# Altium footprint library iMag.PcbLib: 52 footprints (part 2 of 4)
Each footprint in its own frame and in the unit in brackets; x right, y up, seen from the top. Pads: shape width x height; smd on the part's side, far side on the other; paste and mask are expansions set on the pad; w line width, h text height; cw(c..) or ccw(c..) is an arc to the next point about the centre after c.
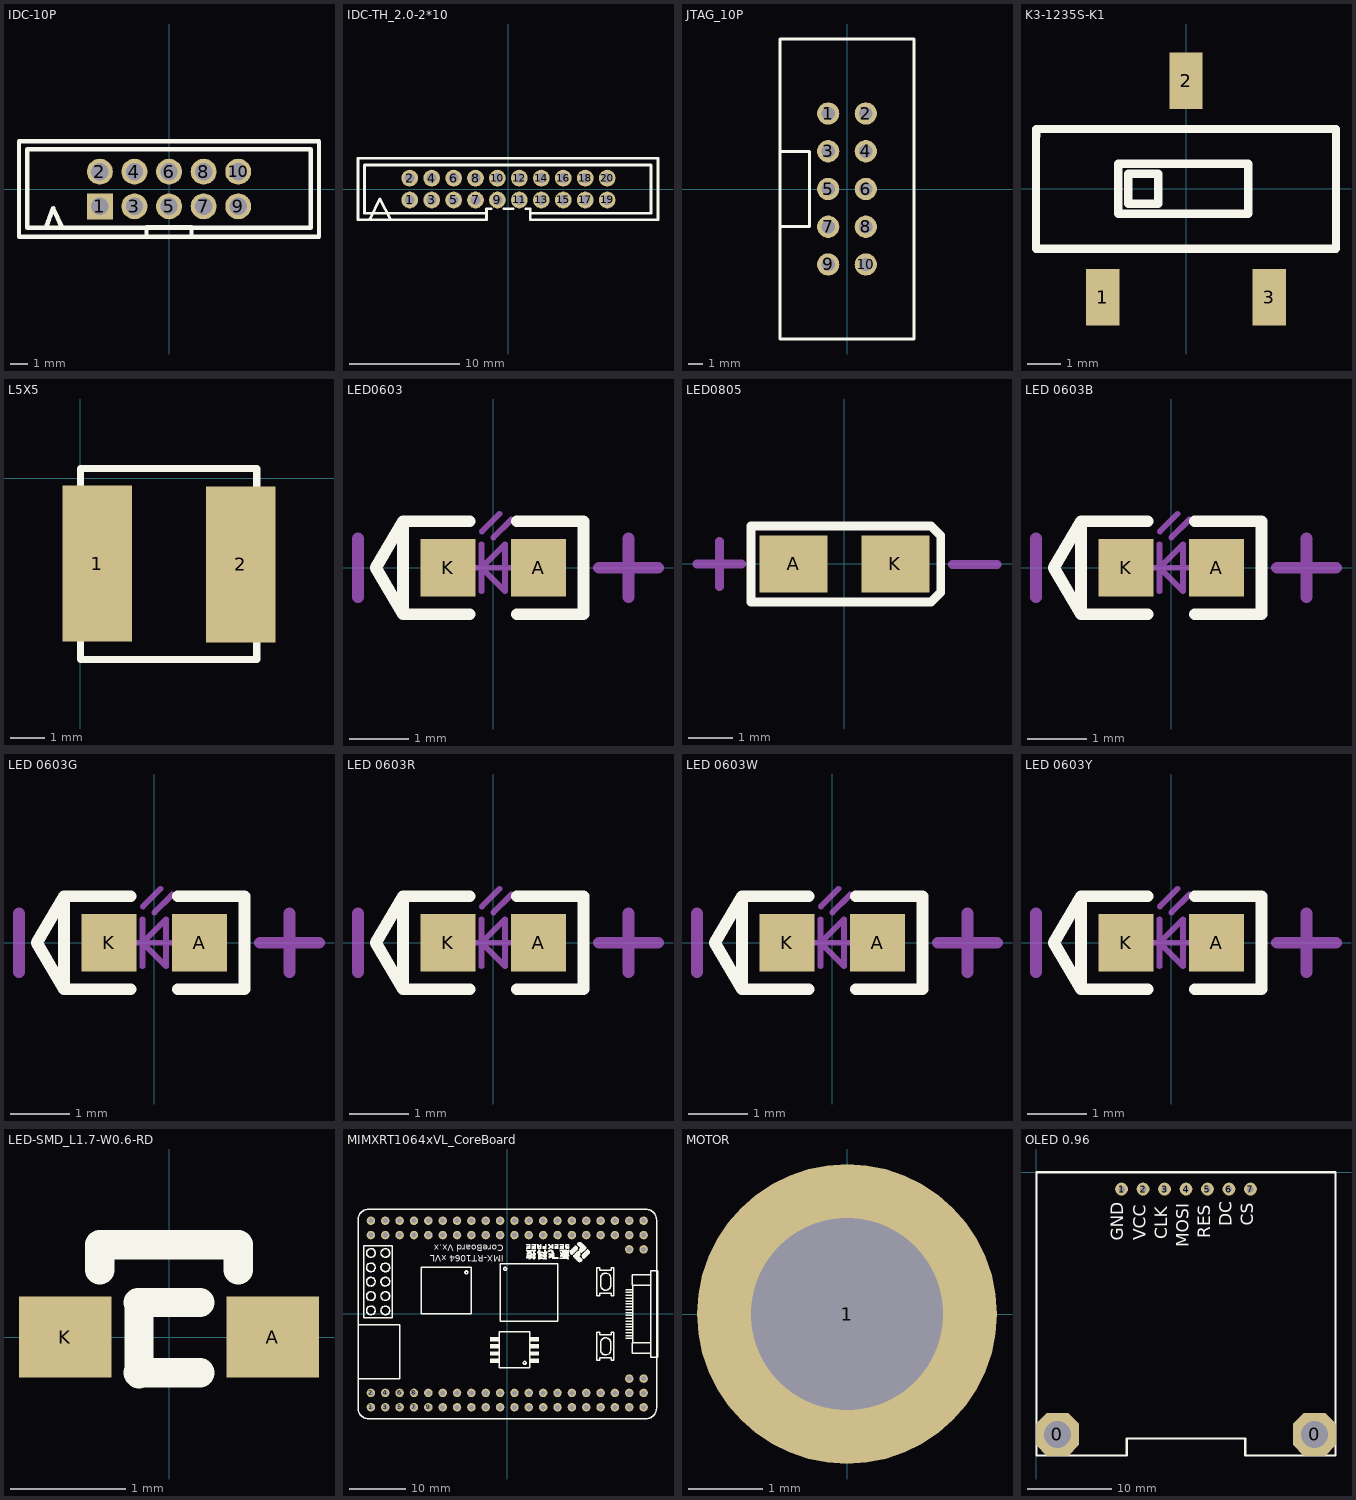
[diagram p1: the footprints below, top view; thin cyan lines are the x and y axes]

## IDC-10P [mm]
pads (10):
  rect 1.5x1.5 hole 1: 1(-4,-1)
  round 1.5 hole 1: 2(-4,1) 3(-2,-1) 4(-2,1) 5(0,-1) 6(0,1) 7(2,-1) 8(2,1) 9(4,-1) 10(4,1)
Top Overlay:
  lines w0.254: -7.1,-2.2 -6.7,-1.1 -6.2,-2.2 ; -1.3,-2.749 -1.3,-2.201 1.301,-2.201 1.301,-2.749 ; -8.672,-2.75 8.668,-2.75 8.668,2.75 -8.672,2.75 -8.672,-2.75 ; -8.2,-2.25 8.2,-2.25 8.2,2.3 -8.2,2.3 -8.2,-2.25

## IDC-TH_2.0-2*10 [mil]
pads (20):
  round 60 hole 36: 1(-354.35,-39.35) 2(-354.35,39.35) 3(-275.55,-39.35) 4(-275.55,39.35) 5(-196.85,-39.35) 6(-196.85,39.35) 7(-118.15,-39.35) 8(-118.15,39.35) 9(-39.35,-39.35) 10(-39.35,39.35) 11(39.35,-39.35) 12(39.35,39.35) 13(118.15,-39.35) 14(118.15,39.35) 15(196.85,-39.35) 16(196.85,39.35) 17(275.55,-39.35) 18(275.55,39.35) 19(354.35,-39.35) 20(354.35,39.35)
Top Overlay:
  lines w10: -539.95,-110.07 -539.95,110.41 ; -539.82,-110.19 -79.19,-110.19 -79.19,-106.25 -79.19,-70.82 -62.49,-70.82 ; -537.85,110.29 536.95,110.29 536.95,-110.19 ; -500.45,86.66 511.36,86.66 511.36,-86.56 82.23,-86.56 ; -496.55,-106.25 -461.08,-35.38 -421.71,-110.19 ; -496.51,86.66 -516.2,86.66 -516.2,-86.56 -79.19,-86.56 ; -16.21,-70.82 16.21,-70.82 ; 62.49,-70.82 78.29,-70.82 78.29,-98.38 78.29,-110.19 534.98,-110.19

## JTAG_10P [mm] "JTAG_10P"
pads (10):
  round 1.5 hole 0.9: 1(-1.27,5.08) 2(1.27,5.08) 3(-1.27,2.54) 4(1.27,2.54) 5(-1.27,0) 6(1.27,0) 7(-1.27,-2.54) 8(1.27,-2.54) 9(-1.27,-5.08) 10(1.27,-5.08)
Top Overlay:
  lines w0.2: -4.5,-2.54 -2.54,-2.54 -2.54,2.54 -4.5,2.54 ; -4.5,-10.1 4.5,-10.1 4.5,10.1 -4.5,10.1 -4.5,-10.1
3D body "User Library-IDC Socket Male 10pin Straight THT Goldplated 2_54mm.step": height 9.03, standoff -3.37, extent -4.425,-10.15 4.425,10.15

## K3-1235S-K1 [mm]
pads (3):
  rect 1x1.7 smd: 1(-2.5,-3.25) 2(-0.002,3.25) 3(2.5,-3.25)
Top Overlay:
  lines w0.254: -4.502,-1.799 -4.502,1.284 -4.5,1.8 4.499,1.8 4.499,-1.799 -4.502,-1.799 ; -2.032,-0.738 -2.032,0.762 1.868,0.762 1.868,-0.738 -2.032,-0.738 ; -1.732,-0.438 -0.832,-0.438 -0.832,0.462 -1.732,0.462 -1.732,-0.438

## L5X5 [mm]
pads (2):
  rect 2x4.5 smd: 1(0.483,-2.464) 2(4.623,-2.489)
Top Overlay:
  lines w0.203: 0,-5.232 5.08,-5.232 5.08,0.279 0,0.279 0,-5.232
3D body "CDRH4D28.step": height 2.91, standoff 0, extent 0.065,-4.914 4.965,-0.014

## LED0603 [mm]
pads (2):
  rect 0.93x0.98 smd: A(0.77,0) K(-0.77,0)
Top Overlay:
  lines w0.2: -0.4,-0.79 -1.535,-0.79 ; -0.4,0.79 -1.535,0.79 ; 0.4,-0.79 1.535,-0.79 1.535,0.79 0.4,0.79 ; -1.535,-0.79 -2,0 -1.535,0.79 ; -1.535,-0.79 -1.535,0.79
Mechanical 13:
  lines w0.1: -0.4,0 0.4,0 ; -0.2,-0.4 -0.2,0.4 ; -0.195,0.617 0.105,0.917 ; 0.005,0.517 0.305,0.817 ; -0.2,0 0.2,0.4 0.2,-0.4 -0.2,0
Mechanical 15:
  lines w0.203: -2.3,-0.5 -2.3,0.5 ; 1.8,0 2.8,0 ; 2.3,-0.5 2.3,0.5
3D body "User Library-LED_0603_R.STEP": height 0.6, standoff 0, extent -0.8,-0.4 0.8,0.4

## LED0805 [mil]
pads (2):
  rect 60x50 smd: A(-45,0) K(45,0)
Top Overlay:
  lines w7.87: -82.68,-33.46 76.54,-33.46 85,-25 85,25 76.54,33.46 75,33.46 -82.68,33.46 -82.68,-33.46
Mechanical 15:
  lines w8: -130.24,0 -90.87,0 ; -110.55,-19.69 -110.55,19.68 ; 95.31,-0.55 134.68,-0.55
3D body "User Library-LED SMD0805.step": height 33.45, standoff 0.23, extent -40.6,-17.84 40.6,17.84

## LED 0603B [mm] "蓝色0603LED"
pads (2):
  rect 0.93x0.98 smd: A(0.77,0) K(-0.77,0)
Top Overlay:
  lines w0.2: -0.4,-0.79 -1.535,-0.79 ; -0.4,0.79 -1.535,0.79 ; 0.4,-0.79 1.535,-0.79 1.535,0.79 0.4,0.79 ; -1.535,-0.79 -1.535,0.79 ; -1.535,-0.79 -2,0 -1.535,0.79
Mechanical 13:
  lines w0.1: -0.4,0 0.4,0 ; -0.2,-0.4 -0.2,0.4 ; -0.195,0.617 0.105,0.917 ; 0.005,0.517 0.305,0.817 ; -0.2,0 0.2,-0.4 0.2,0.4 -0.2,0
Mechanical 15:
  lines w0.203: -2.3,-0.5 -2.3,0.5 ; 1.8,0 2.8,0 ; 2.3,-0.5 2.3,0.5
3D body "LED 0603-B.STEP": height 0.47, standoff 0, extent -0.8,-0.401 0.8,0.401
3D body "LED 0603玻璃罩.STEP": height 0.61, standoff 0.21, extent -0.599,-0.401 0.599,0.401

## LED 0603G [mm] "绿色0603LED"
pads (2):
  rect 0.93x0.98 smd: A(0.77,0) K(-0.77,0)
Top Overlay:
  lines w0.2: -0.4,-0.79 -1.535,-0.79 ; -0.4,0.79 -1.535,0.79 ; 0.4,-0.79 1.535,-0.79 1.535,0.79 0.4,0.79 ; -1.535,-0.79 -2,0 -1.535,0.79 ; -1.535,-0.79 -1.535,0.79
Mechanical 13:
  lines w0.1: -0.4,0 0.4,0 ; -0.2,-0.4 -0.2,0.4 ; -0.195,0.617 0.105,0.917 ; 0.005,0.517 0.305,0.817 ; -0.2,0 0.2,0.4 0.2,-0.4 -0.2,0
Mechanical 15:
  lines w0.203: -2.3,-0.5 -2.3,0.5 ; 1.8,0 2.8,0 ; 2.3,-0.5 2.3,0.5
3D body "LED 0603玻璃罩.STEP": height 0.61, standoff 0.21, extent -0.599,-0.401 0.599,0.401
3D body "LED 0603-G.STEP": height 0.47, standoff 0, extent -0.8,-0.401 0.8,0.401

## LED 0603R [mm] "红色0603LED"
pads (2):
  rect 0.93x0.98 smd: A(0.77,0) K(-0.77,0)
Top Overlay:
  lines w0.2: -0.4,-0.79 -1.535,-0.79 ; -0.4,0.79 -1.535,0.79 ; 0.4,-0.79 1.535,-0.79 1.535,0.79 0.4,0.79 ; -1.535,-0.79 -2,0 -1.535,0.79 ; -1.535,-0.79 -1.535,0.79
Mechanical 13:
  lines w0.1: -0.4,0 0.4,0 ; -0.2,-0.4 -0.2,0.4 ; -0.195,0.617 0.105,0.917 ; 0.005,0.517 0.305,0.817 ; -0.2,0 0.2,0.4 0.2,-0.4 -0.2,0
Mechanical 15:
  lines w0.203: -2.3,-0.5 -2.3,0.5 ; 1.8,0 2.8,0 ; 2.3,-0.5 2.3,0.5
3D body "LED 0603-R.STEP": height 0.47, standoff 0, extent -0.8,-0.401 0.8,0.401
3D body "LED 0603玻璃罩.STEP": height 0.61, standoff 0.21, extent -0.599,-0.401 0.599,0.401

## LED 0603W [mm] "白色0603LED"
pads (2):
  rect 0.93x0.98 smd: A(0.77,0) K(-0.77,0)
Top Overlay:
  lines w0.2: -0.4,-0.79 -1.535,-0.79 ; -0.4,0.79 -1.535,0.79 ; 0.4,-0.79 1.535,-0.79 1.535,0.79 0.4,0.79 ; -1.535,-0.79 -2,0 -1.535,0.79 ; -1.535,-0.79 -1.535,0.79
Mechanical 13:
  lines w0.1: -0.4,0 0.4,0 ; -0.2,-0.4 -0.2,0.4 ; -0.195,0.617 0.105,0.917 ; 0.005,0.517 0.305,0.817 ; -0.2,0 0.2,0.4 0.2,-0.4 -0.2,0
Mechanical 15:
  lines w0.203: -2.3,-0.5 -2.3,0.5 ; 1.8,0 2.8,0 ; 2.3,-0.5 2.3,0.5
3D body "LED 0603玻璃罩.STEP": height 0.61, standoff 0.21, extent -0.599,-0.401 0.599,0.401
3D body "LED 0603-W.STEP": height 0.47, standoff 0, extent -0.8,-0.401 0.8,0.401

## LED 0603Y [mm] "黄色0603LED"
pads (2):
  rect 0.93x0.98 smd: A(0.77,0) K(-0.77,0)
Top Overlay:
  lines w0.2: -0.4,-0.79 -1.535,-0.79 ; -0.4,0.79 -1.535,0.79 ; 0.4,-0.79 1.535,-0.79 1.535,0.79 0.4,0.79 ; -1.535,-0.79 -2,0 -1.535,0.79 ; -1.535,-0.79 -1.535,0.79
Mechanical 13:
  lines w0.1: -0.4,0 0.4,0 ; -0.2,-0.4 -0.2,0.4 ; -0.195,0.617 0.105,0.917 ; 0.005,0.517 0.305,0.817 ; -0.2,0 0.2,0.4 0.2,-0.4 -0.2,0
Mechanical 15:
  lines w0.203: -2.3,-0.5 -2.3,0.5 ; 1.8,0 2.8,0 ; 2.3,-0.5 2.3,0.5
3D body "LED 0603玻璃罩.STEP": height 0.61, standoff 0.21, extent -0.599,-0.401 0.599,0.401
3D body "LED 0603-Y.STEP": height 0.47, standoff 0, extent -0.8,-0.408 0.8,0.395

## LED-SMD_L1.7-W0.6-RD [mm]
pads (2):
  rect 0.8x0.7 smd: A(0.9,0) K(-0.9,0)
Top Overlay:
  lines w0.254: -0.6,0.581 -0.6,0.8 0.6,0.8 0.6,0.581 ; -0.269,-0.31 0.269,-0.31 ; -0.269,0.3 0.269,0.3 ; -0.26,-0.32 -0.26,0.279
3D body "LED 0603玻璃罩.STEP": height 0.61, standoff 0.21, extent -0.599,-0.401 0.599,0.401
3D body "LED 0603-G.STEP": height 0.47, standoff 0, extent -0.8,-0.401 0.8,0.401

## MIMXRT1064xVL_CoreBoard [mm] "逐飞科技i.MX RT1064核心板整体封装，可直接使用"
pads (84):
  round 1.5 hole 0.9: 1(-24.13,-16.51) 2(-24.13,-13.97) 3(-21.59,-16.51) 4(-21.59,-13.97) 5(-19.05,-16.51) 6(-19.05,-13.97) 7(-16.51,-16.51) 8(-16.51,-13.97) 9(-13.97,-16.51) 10(-13.97,-13.97) 11(-11.43,-16.51) 12(-11.43,-13.97) 13(-8.89,-16.51) 14(-8.89,-13.97) 15(-6.35,-16.51) 16(-6.35,-13.97) 17(-3.81,-16.51) 18(-3.81,-13.97) 19(-1.27,-16.51) 20(-1.27,-13.97) 21(1.27,-16.51) 22(1.27,-13.97) 23(3.81,-16.51) 24(3.81,-13.97) 25(6.35,-16.51) 26(6.35,-13.97) 27(8.89,-16.51) 28(8.89,-13.97) 29(11.43,-16.51) 30(11.43,-13.97) 31(13.97,-16.51) 32(13.97,-13.97) 33(16.51,-16.51) 34(16.51,-13.97) 35(19.05,-16.51) 36(19.05,-13.97) 37(21.59,-16.51) 38(21.59,-13.97) 39(24.13,-16.51) 40(24.13,-13.97) 41(21.59,-11.43) 42(24.13,-11.43) 43(24.13,11.43) 44(21.59,11.43) 45(24.13,13.97) 46(24.13,16.51) 47(21.59,13.97) 48(21.59,16.51) 49(19.05,13.97) 50(19.05,16.51) 51(16.51,13.97) 52(16.51,16.51) 53(13.97,13.97) 54(13.97,16.51) 55(11.43,13.97) 56(11.43,16.51) 57(8.89,13.97) 58(8.89,16.51) 59(6.35,13.97) 60(6.35,16.51) 61(3.81,13.97) 62(3.81,16.51) 63(1.27,13.97) 64(1.27,16.51) 65(-1.27,13.97) 66(-1.27,16.51) 67(-3.81,13.97) 68(-3.81,16.51) 69(-6.35,13.97) 70(-6.35,16.51) 71(-8.89,13.97) 72(-8.89,16.51) 73(-11.43,13.97) 74(-11.43,16.51) 75(-13.97,13.97) 76(-13.97,16.51) 77(-16.51,13.97) 78(-16.51,16.51) 79(-19.05,13.97) 80(-19.05,16.51) 81(-21.59,13.97) 82(-21.59,16.51) 83(-24.13,13.97) 84(-24.13,16.51)
Top Overlay:
  drawing of 877 lines, arcs and shapes, not listed
  text "IMX-RT1064 xVL" at -0.635,10.795 h2.03
  text "CoreBoard Vx.x" at -0.635,12.7 h2.03
3D body "IDC6.STEP": height 8.5, standoff -3.35, extent 20.487,10.16 25.487,17.78
3D body "IDC6.STEP": height 8.5, standoff -3.35, extent 20.36,-17.78 25.36,-10.16
3D body "IDC36.STEP": height 8.5, standoff -3.35, extent -25.273,12.74 20.447,17.74
3D body "IDC36.STEP": height 8.5, standoff -3.35, extent -25.4,-17.74 20.32,-12.74

## MOTOR [mil] "镀金香蕉头2mm"
pads (1):
  round 160 hole 102.36: 1(0,0)

## OLED 0.96 [mil]
pads (9):
  oct 200x200 hole 125.98: 0(98.43,-1220.47) 0(1295.28,-1220.47)
  round 60 hole 30: 1(396.85,-78.74) 2(496.85,-78.74) 3(596.85,-78.74) 4(696.85,-78.74) 5(796.85,-78.74) 6(896.85,-78.74) 7(996.85,-78.74)
Top Overlay:
  lines w10: 419.8,-1318.9 0,-1318.9 0,0 1393.7,0 1393.7,-1318.9 972.44,-1318.9 972.44,-1240.16 421.26,-1240.16 421.26,-1318.9
  text "GND" at 425,-320 h100
  text "VCC" at 529.79,-317.72 h100
  text "CLK" at 629.79,-312.91 h100
  text "MOSI" at 729.79,-350 h100
  text "RES" at 829.79,-306.43 h100
  text "DC" at 929.79,-251.49 h100
  text "CS" at 1029.79,-249.08 h100
3D body "OLED带PCB.step": height 333.57, standoff -93.43, extent 215,-1083.43 1266.18,13.43